# Altium footprint library My Library.PCBLIB: 198 footprints (part 9 of 13)
Each footprint in its own frame and in the unit in brackets; x right, y up, seen from the top. Pads: shape width x height; smd on the part's side, far side on the other; paste and mask are expansions set on the pad; w line width, h text height; cw(c..) or ccw(c..) is an arc to the next point about the centre after c.
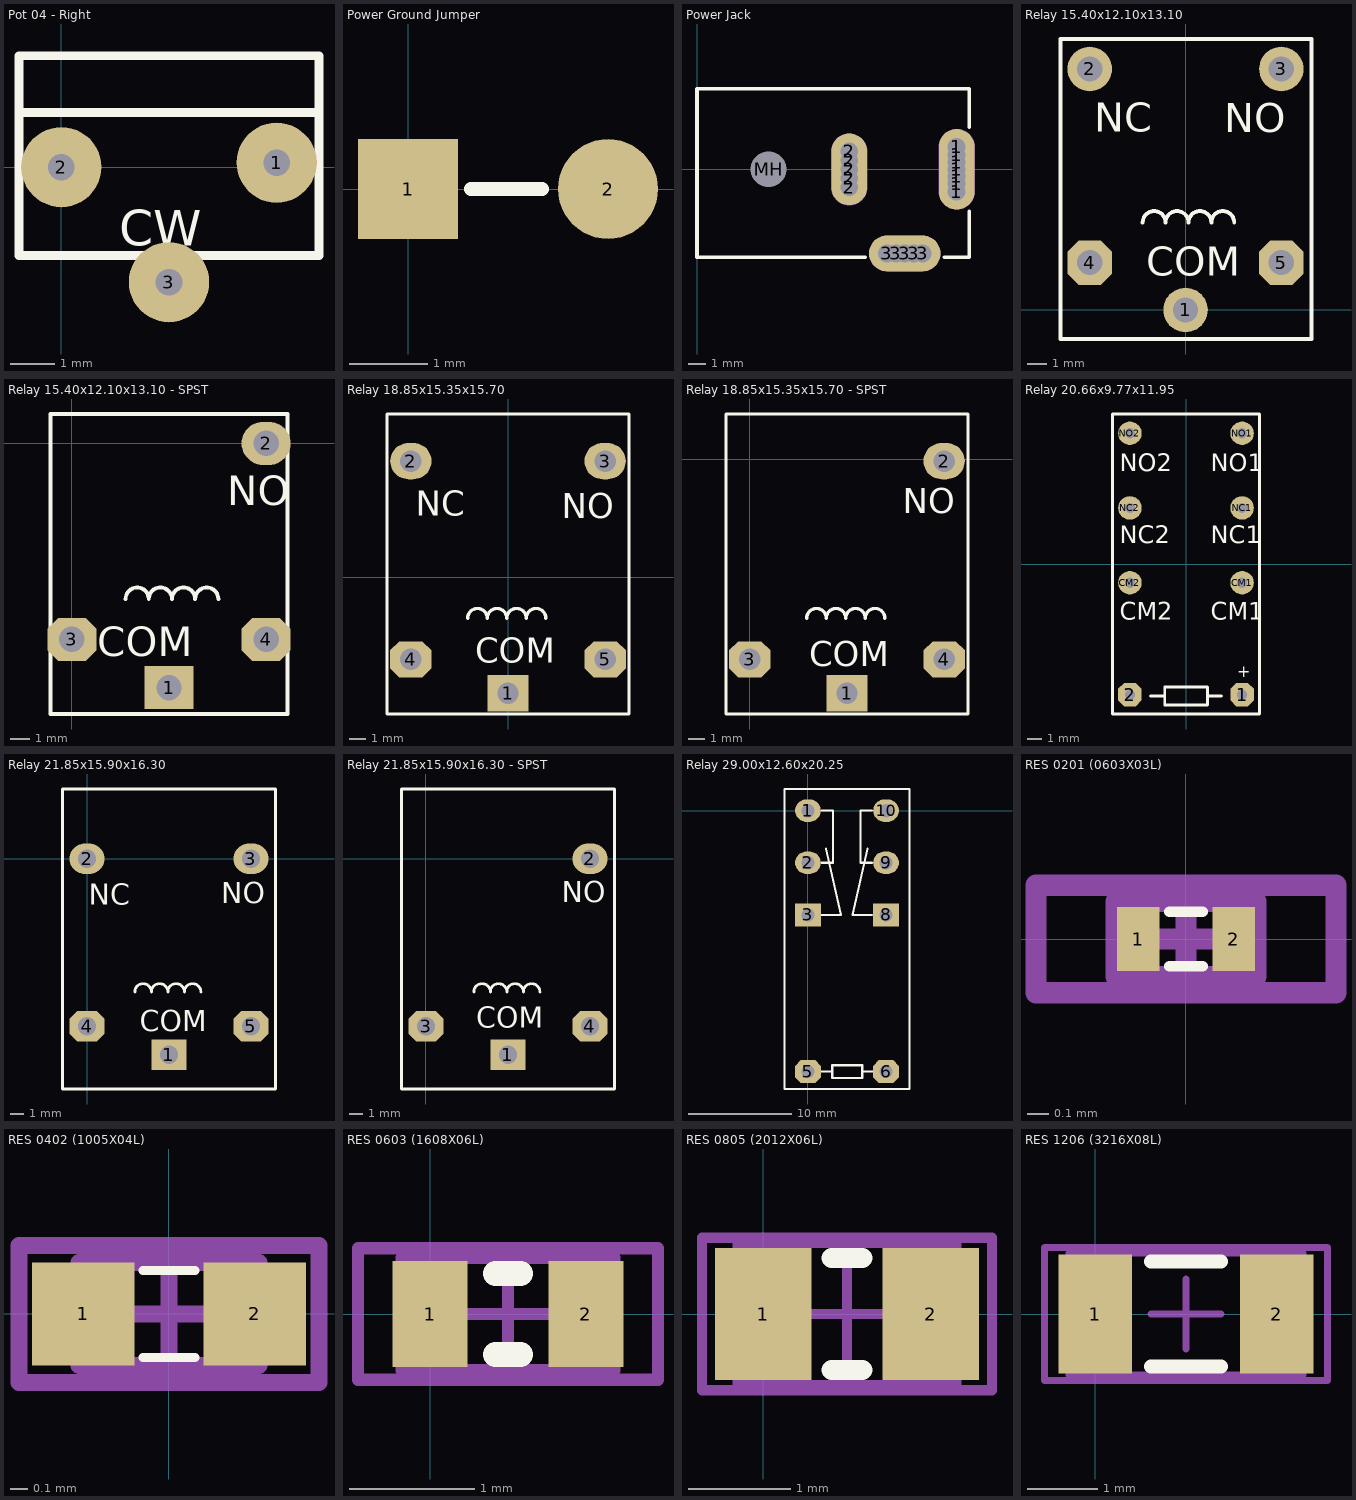
[diagram p8: the footprints below, top view; thin cyan lines are the x and y axes]

## Pot 04 - Right [mm]
height 7.4
pads (3):
  round 1.8 hole 0.6: 1(4.83,0.1) 2(0,0) 3(2.415,-2.58)
Top Overlay:
  lines w0.2: -0.95,1.23 5.78,1.23 ; -0.95,-1.98 5.78,-1.98 5.78,2.5 -0.95,2.5 -0.95,-1.98
  text "CW" at 1.295,-1.76 h0.8

## Power Ground Jumper [mil]
pads (2):
  rect 50x50 smd: 1(0,0)
  round 50 smd: 2(100,0)
Top Overlay:
  lines w7: 31.5,0 66.93,0

## Power Jack [mm] "Power Adaptor Jack"
pads (18):
  round 1.5 hole 1: 1(14.5,-1.25) 1(14.5,-0.8) 1(14.5,-0.4) 1(14.5,0.4) 1(14.5,0.8) 1(14.5,1.25) 2(8.5,-1) 2(8.5,1) 2(8.5,-0.5) 2(8.5,0.5) 3(10.6,-4.7) 3(11.1,-4.7) 3(12.1,-4.7) 3(12.6,-4.7)
  oval 2x4.5 hole 1: 1(14.5,0)
  oval 2x4 hole 1: 2(8.5,0)
  oval 4x2 hole 1: 3(11.6,-4.7)
  round 1.9 hole 2: MH(4,0)
Top Overlay:
  lines w0.2: 9.4,-4.9 0,-4.9 0,4.5 15.2,4.5 15.2,2.35 ; 13.8,-4.9 15.2,-4.9 15.2,-2.35
Mechanical 1:
  lines w1: 8.5,-1 8.5,1 ; 10.6,-4.7 12.6,-4.7 ; 14.5,-1.25 14.5,1.25
Mechanical 2:
  lines w2.016: 8.5,-1 8.5,1 ; 10.6,-4.7 12.6,-4.7 ; 14.5,-1.25 14.5,1.25
3D body "SW3dPS-PowerJack-2.5x5.7mm.STEP": height 11, standoff -3.5, extent 0,-4.9 15.2,4.5

## Relay 15.40x12.10x13.10 [mm]
height 13.1
pads (5):
  round 2.3 hole 1.3: 1(0,0) 2(-4.95,12.45) 3(4.95,12.45)
  oct 2.3x2.3 hole 1.3: 4(-4.95,2.45) 5(4.95,2.45)
Top Overlay:
  lines w0.2: -2.213,4.515 cw(c-1.622,4.515) -1.031,4.515 cw(c-0.44,4.515) 0.151,4.515 cw(c0.742,4.515) 1.333,4.515 cw(c1.924,4.515) 2.515,4.515 ; -6.45,-1.5 6.5,-1.5 6.5,14 -6.45,14 -6.45,-1.5
  text "COM" at -2.032,1.778 h1.5
  text "NO" at 2.007,9.169 h1.5
  text "NC" at -4.724,9.22 h1.5
3D body "relay.STEP": height 15.6, standoff -2, extent -6.05,-1.3 6.05,14

## Relay 15.40x12.10x13.10 - SPST [mm]
height 13.1
pads (4):
  rect 2.5x2.2 hole 1.3: 1(4.95,-12.45)
  oval 2.5x2.2 hole 1.3: 2(9.9,0)
  oct 2.5x2.2 hole 1.3: 3(0,-10) 4(9.9,-10)
Top Overlay:
  lines w0.2: 2.737,-7.935 cw(c3.328,-7.935) 3.919,-7.935 cw(c4.51,-7.935) 5.101,-7.935 cw(c5.692,-7.935) 6.283,-7.935 cw(c6.874,-7.935) 7.465,-7.935 ; -1.1,-13.8 -1.1,1.5 11,1.5 11,-13.8 -1.1,-13.8
  text "NO" at 7.925,-3.15 h1.5
  text "COM" at 1.295,-10.86 h1.5

## Relay 18.85x15.35x15.70 [mm]
height 15.7
pads (5):
  rect 2.5x2.2 hole 1.3: 1(0,-7.025)
  oval 2.5x2.2 hole 1.3: 2(-5.875,7.025) 3(5.875,7.025)
  oct 2.5x2.2 hole 1.3: 4(-5.875,-4.975) 5(5.875,-4.975)
Top Overlay:
  lines w0.2: -2.438,-2.48 cw(c-1.847,-2.48) -1.256,-2.48 cw(c-0.665,-2.48) -0.074,-2.48 cw(c0.517,-2.48) 1.108,-2.48 cw(c1.699,-2.48) 2.29,-2.48 ; -7.325,-8.275 -7.325,9.875 7.325,9.875 7.325,-8.275 -7.325,-8.275
  text "COM" at -1.981,-5.182 h1.5
  text "NO" at 3.251,3.556 h1.5
  text "NC" at -5.588,3.734 h1.5
3D body "relay2.STEP": height 15.7, standoff -1.8, extent -7.366,-8.715 7.634,9.985

## Relay 18.85x15.35x15.70 - SPST [mm]
height 15.7
pads (4):
  rect 2.5x2.2 hole 1.3: 1(5.885,-14.15)
  oval 2.5x2.2 hole 1.3: 2(11.76,-0.1)
  oct 2.5x2.2 hole 1.3: 3(0.01,-12.1) 4(11.76,-12.1)
Top Overlay:
  lines w0.2: 3.447,-9.605 cw(c4.038,-9.605) 4.629,-9.605 cw(c5.22,-9.605) 5.811,-9.605 cw(c6.402,-9.605) 6.993,-9.605 cw(c7.584,-9.605) 8.175,-9.605 ; -1.44,-15.4 -1.44,2.75 13.21,2.75 13.21,-15.4 -1.44,-15.4
  text "COM" at 3.607,-12.522 h1.5
  text "NO" at 9.246,-3.251 h1.5

## Relay 20.66x9.77x11.95 [mm]
height 11.95
pads (8):
  oct 1.6x1.6 hole 0.7: 1(3.81,-8.89) 2(-3.81,-8.89)
  round 1.6 hole 0.7: CM1(3.81,-1.27) CM2(-3.81,-1.27) NC1(3.81,3.81) NC2(-3.81,3.81) NO1(3.81,8.89) NO2(-3.81,8.89)
Top Overlay:
  lines w0.2: -2.4,-8.98 -1.447,-8.98 ; 1.472,-8.98 2.4,-8.98 ; -5,-10.2 5,-10.2 5,10.2 -5,10.2 -5,-10.2 ; -1.447,-9.59 1.472,-9.59 1.472,-8.371 -1.447,-8.371 -1.447,-9.59
  text "CM2" at -4.5,-3.8 h1.2
  text "NC2" at -4.5,1.4 h1.2
  text "NO2" at -4.5,6.3 h1.2
  text "NO1" at 1.7,6.3 h1.2
  text "NC1" at 1.7,1.4 h1.2
  text "CM1" at 1.7,-3.8 h1.2
  text "+" at 3.5,-7.7 h0.8
3D body "OMROM G5V-2 DPDT Mini Relay -TH.STEP": height 11, standoff -3.7, extent -4.925,-10.1 4.925,10.1

## Relay 21.85x15.90x16.30 [mm]
height 16.3
pads (5):
  rect 2.5x2.2 hole 1.3: 1(5.875,-14.05)
  oval 2.5x2.2 hole 1.3: 2(0,0) 3(11.75,0)
  oct 2.5x2.2 hole 1.3: 4(0,-12) 5(11.75,-12)
Top Overlay:
  lines w0.2: 3.43,-9.54 cw(c4.021,-9.54) 4.612,-9.54 cw(c5.203,-9.54) 5.794,-9.54 cw(c6.385,-9.54) 6.976,-9.54 cw(c7.567,-9.54) 8.158,-9.54 ; -1.75,-16.5 13.5,-16.5 13.5,5 -1.75,5 -1.75,-16.5
  text "NC" at 0.127,-3.302 h1.5
  text "NO" at 9.627,-3.175 h1.5
  text "COM" at 3.785,-12.344 h1.5

## Relay 21.85x15.90x16.30 - SPST [mm]
height 16.3
pads (4):
  rect 2.5x2.2 hole 1.3: 1(5.885,-14.04)
  oval 2.5x2.2 hole 1.3: 2(11.76,0.01)
  oct 2.5x2.2 hole 1.3: 3(0.01,-11.99) 4(11.76,-11.99)
Top Overlay:
  lines w0.2: 3.44,-9.53 cw(c4.031,-9.53) 4.622,-9.53 cw(c5.213,-9.53) 5.804,-9.53 cw(c6.395,-9.53) 6.986,-9.53 cw(c7.577,-9.53) 8.168,-9.53 ; -1.74,-16.49 -1.74,5.01 13.51,5.01 13.51,-16.49 -1.74,-16.49
  text "COM" at 3.607,-12.09 h1.5
  text "NO" at 9.754,-3.099 h1.5

## Relay 29.00x12.60x20.25 [mm]
height 20.25
pads (8):
  oval 2.5x2.2 hole 1.3: 1(0,0) 2(0,-5.08) 9(7.6,-5.08) 10(7.6,0)
  rect 2.5x2.2 hole 1.3: 3(0,-10.16) 8(7.6,-10.16)
  oct 2.5x2.2 hole 1.3: 5(0,-25.4) 6(7.6,-25.4)
Top Overlay:
  lines w0.2: 1.32,-25.4 2.364,-25.4 ; 1.32,-10.16 3.195,-10.16 1.752,-3.708 ; 1.32,-5.08 2.42,-5.08 2.42,0 1.32,0 ; 5.282,-25.4 6.324,-25.4 ; 5.786,-3.708 4.343,-10.16 6.218,-10.16 ; 6.22,-5.08 5.12,-5.08 5.12,0 6.22,0 ; -2.3,-27.1 9.9,-27.1 9.9,2.1 -2.3,2.1 -2.3,-27.1 ; 2.364,-26.01 2.364,-24.79 5.282,-24.79 5.282,-26.01 2.364,-26.01

## RES 0201 (0603X03L) [mm] "Chip Resistor, 2-Leads, Body 0.6x0.3mm, IPC High Density (0.05 W)"
height 0.3
pads (2):
  rect 0.2x0.3 smd: 1(-0.223,0) 2(0.223,0)
Top Overlay:
  lines w0.051: -0.076,-0.127 0.076,-0.127 ; -0.076,0.127 0.076,0.127
Mechanical 13:
  lines w0.1: -0.325,-0.175 -0.325,0.175 0.325,0.175 0.325,-0.175 -0.325,-0.175
Mechanical 15:
  lines w0.1: -0.175,0 0.175,0 ; 0,-0.175 0,0.175 ; -0.7,-0.25 -0.7,0.25 0.7,0.25 0.7,-0.25 -0.7,-0.25
3D body "0201.STEP": height 0.25, standoff 0, extent -0.254,-0.127 0.254,0.127

## RES 0402 (1005X04L) [mm] "Chip Resistor, 2-Leads, Body 1.0x0.5mm, IPC High Density _ (0.031/0.063 W)"
height 0.4
pads (2):
  rect 0.6x0.6 smd: 1(-0.5,0) 2(0.5,0)
Top Overlay:
  lines w0.051: -0.152,-0.254 0.152,-0.254 ; -0.152,0.254 0.152,0.254
Mechanical 13:
  lines w0.1: -0.525,-0.3 -0.525,0.3 0.525,0.3 0.525,-0.3 -0.525,-0.3
Mechanical 15:
  lines w0.1: -0.3,0 0.3,0 ; 0,-0.3 0,0.3 ; -0.875,-0.4 -0.875,0.4 0.875,0.4 0.875,-0.4 -0.875,-0.4
3D body "0402.STEP": height 0.35, standoff 0, extent -0.508,-0.254 0.508,0.254

## RES 0603 (1608X06L) [mm] "Chip Resistor, 2-Leads, Body 1.6x0.8mm, IPC High Density _ (0.063W)"
height 0.6
pads (2):
  rect 0.6x0.85 smd: 1(0,0) 2(1.244,0)
Top Overlay:
  lines w0.2: 0.522,-0.325 0.722,-0.325 ; 0.522,0.325 0.722,0.325
Mechanical 13:
  lines w0.1: -0.228,-0.45 1.472,-0.45 1.472,0.45 -0.228,0.45 -0.228,-0.45
Mechanical 15:
  lines w0.1: 0.172,0 1.072,0 ; 0.622,-0.45 0.622,0.45 ; -0.578,-0.525 1.822,-0.525 1.822,0.525 -0.578,0.525 -0.578,-0.525
3D body "0603.STEP": height 0.45, standoff 0, extent -0.14,-0.381 1.384,0.381

## RES 0805 (2012X06L) [mm] "Chip Resistor, 2-Leads, Body 2.0x1.3mm, IPC High Density _ (0.100 W)"
height 0.65
pads (2):
  rect 0.95x1.3 smd: 1(0,0) 2(1.65,0)
Top Overlay:
  lines w0.2: 0.675,-0.55 0.975,-0.55 ; 0.675,0.55 0.975,0.55
Mechanical 13:
  lines w0.1: -0.25,-0.7 -0.25,0.7 1.9,0.7 1.9,-0.7 -0.25,-0.7
Mechanical 15:
  lines w0.1: 0.325,0 1.325,0 ; 0.825,-0.5 0.825,0.5 ; -0.6,-0.75 -0.6,0.75 2.25,0.75 2.25,-0.75 -0.6,-0.75
3D body "0805.STEP": height 0.6, standoff 0, extent -0.191,-0.635 1.841,0.635

## RES 1206 (3216X08L) [mm] "Chip Resistor, 2-Leads, Body 3.2x1.6mm, IPC High Density _ (0.125 W)"
height 0.75
pads (2):
  rect 1.05x1.7 smd: 1(0,0) 2(2.596,0)
Top Overlay:
  lines w0.2: 0.798,-0.75 1.798,-0.75 ; 0.798,0.75 1.798,0.75
Mechanical 13:
  lines w0.1: -0.377,-0.875 -0.377,0.875 2.973,0.875 2.973,-0.875 -0.377,-0.875
Mechanical 15:
  lines w0.1: 0.798,0 1.798,0 ; 1.298,-0.5 1.298,0.5 ; -0.727,-0.95 -0.727,0.95 3.323,0.95 3.323,-0.95 -0.727,-0.95
3D body "1206.STEP": height 0.6, standoff 0, extent -0.226,-0.762 2.822,0.762